# Altium footprint library MEGAphone.PcbLib: 64 footprints (part 3 of 4)
Each footprint in its own frame and in the unit in brackets; x right, y up, seen from the top. Pads: shape width x height; smd on the part's side, far side on the other; paste and mask are expansions set on the pad; w line width, h text height; cw(c..) or ccw(c..) is an arc to the next point about the centre after c.
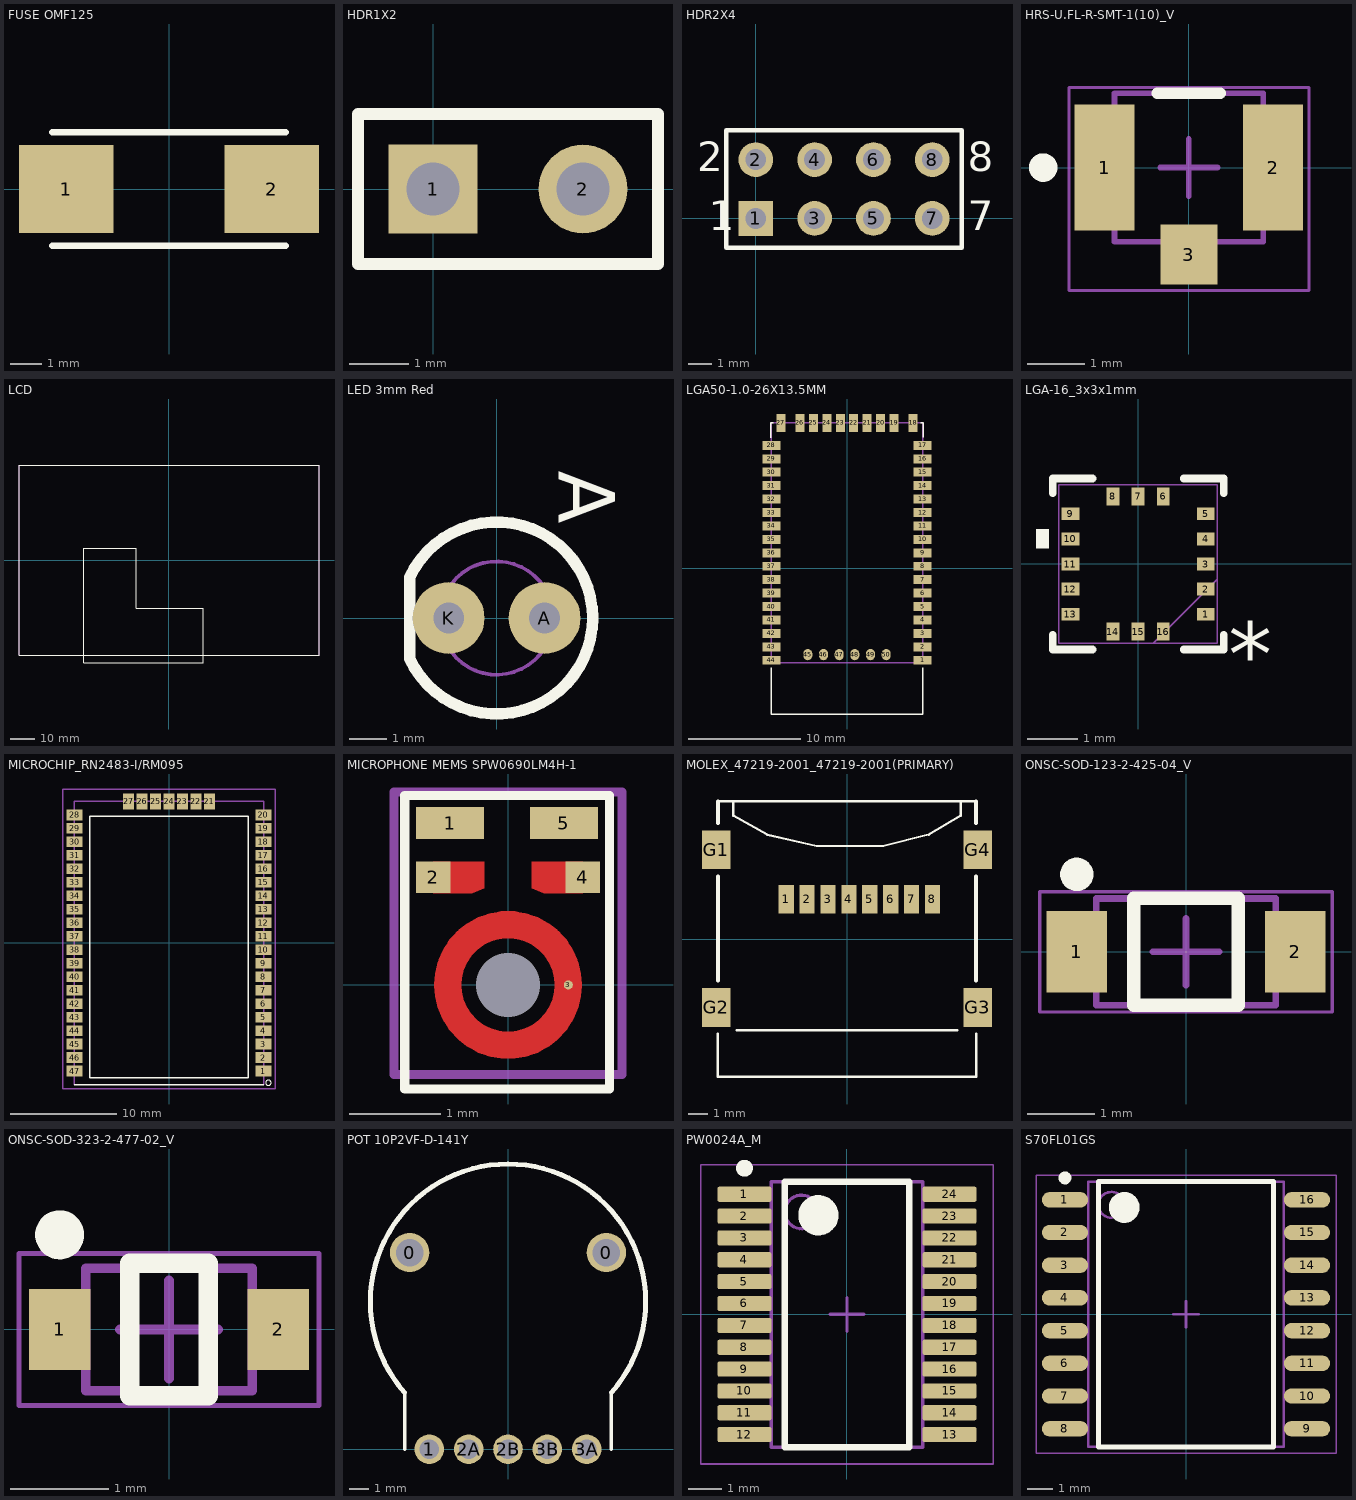
[diagram p2: the footprints below, top view; thin cyan lines are the x and y axes]

## FUSE OMF125 [mm] "SCHURTER OMF125"
height 2.6
pads (2):
  rect 3x2.8 smd: 1(-3.25,0) 2(3.25,0)
Top Overlay:
  lines w0.2: -3.7,-1.8 0,-1.8 3.7,-1.8 ; -3.7,1.8 0,1.8 3.7,1.8
3D body "3404-0010-11.stp": height 2.58, standoff 0.02, extent -3.7,-1.55 3.7,1.55

## HDR1X2 [mm] "Connector; Header; 2 Position"
pads (2):
  rect 1.5x1.5 hole 0.9: 1(0,0)
  round 1.5 hole 0.9: 2(2.54,0)
Top Overlay:
  lines w0.2: -1.27,-1.27 -1.27,1.27 3.81,1.27 3.81,-1.27 -1.27,-1.27

## HDR2X4 [mm] "Connector; Header; 4x2 Position"
pads (8):
  rect 1.5x1.5 hole 0.9: 1(0,0)
  round 1.5 hole 0.9: 2(0,2.54) 3(2.54,0) 4(2.54,2.54) 5(5.08,0) 6(5.08,2.54) 7(7.62,0) 8(7.62,2.54)
Top Overlay:
  lines w0.2: -1.27,-1.27 -1.27,3.81 8.89,3.81 8.89,-1.27 -1.27,-1.27
  text "8" at 9.144,2.032 h1.27
  text "7" at 9.144,-0.508 h1.27
  text "1" at -2.032,-0.508 h1.27
  text "2" at -2.54,2.032 h1.27

## HRS-U.FL-R-SMT-1(10)_V [mm] "SMD, 3-Leads, Body 2.6x2.6mm"
height 1.25
pads (3):
  rect 1.05x2.2 smd: 1(-1.475,0) 2(1.475,0)
  rect 1x1.05 smd: 3(0,-1.525)
Top Overlay:
  circle w0.25: c-2.55,0 r0.125
  lines w0.2: -0.55,1.3 0.55,1.3
Mechanical 13:
  lines w0.1: -1.3,-1.3 -1.3,1.3 1.3,1.3 1.3,-1.3 -1.3,-1.3
Mechanical 15:
  lines w0.05: -2.1,-2.15 -2.1,1.4 2.1,1.4 2.1,-2.15 -2.1,-2.15
  lines w0.1: -0.5,0 0.5,0 ; 0,-0.5 0,0.5
3D body: height 1.25, standoff 0, extent -0.992,-0.998 1,0.998
3D body: height 0.35, standoff 0, extent -1.3,-1.3 1.3,1.3

## LCD [mm]
Top Overlay:
  lines w0.2: -60.25,-38.25 60.25,-38.25 60.25,38.25 -60.25,38.25 -60.25,-38.25 ; -34.25,-41.25 -34.25,-38.25 -34.25,4.75 -13.25,4.75 -13.25,-19.33 13.75,-19.33 13.75,-38.25 13.75,-41.25 -34.25,-41.25
Mechanical 13:
  lines w0.2: -60.25,-38.25 -60.25,38.25 60.25,38.25 60.25,-38.25 -60.25,-38.25
3D body: height 6.5, standoff 3, extent -60.249,-38.249 60.249,38.249

## LED 3mm Red [mm]
height 3.2
pads (2):
  round 1.9 hole 0.813: A(1.27,0) K(-1.27,0)
Top Overlay:
  lines w0.305: -2.302,-1.073 ccw(c0,0) -2.302,1.073 -2.302,-1.073
  text "A" at 1.643,3.899 h1.5
Mechanical 13:
  circle w0.1: c0,0 r1.5
3D body: height 4.7, standoff 1.7, extent -1.488,-1.497 1.496,1.49
3D body: height 3.2, standoff 0.2, extent -1.488,-1.497 1.5,1.497

## LGA50-1.0-26X13.5MM [mm]
pads (50):
  rect 1.6x0.8 smd: 1(6.75,-8.2) 2(6.75,-7) 3(6.75,-5.8) 4(6.75,-4.6) 5(6.75,-3.4) 6(6.75,-2.2) 7(6.75,-1) 8(6.75,0.2) 9(6.75,1.4) 10(6.75,2.6) 11(6.75,3.8) 12(6.75,5) 13(6.75,6.2) 14(6.75,7.4) 15(6.75,8.6) 16(6.75,9.8) 17(6.75,11) 28(-6.75,11) 29(-6.75,9.8) 30(-6.75,8.6) 31(-6.75,7.4) 32(-6.75,6.2) 33(-6.75,5) 34(-6.75,3.8) 35(-6.75,2.6) 36(-6.75,1.4) 37(-6.75,0.2) 38(-6.75,-1) 39(-6.75,-2.2) 40(-6.75,-3.4) 41(-6.75,-4.6) 42(-6.75,-5.8) 43(-6.75,-7) 44(-6.75,-8.2)
  rect 0.8x1.6 smd: 18(5.9,13) 19(4.2,13) 20(3,13) 21(1.8,13) 22(0.6,13) 23(-0.6,13) 24(-1.8,13) 25(-3,13) 26(-4.2,13) 27(-5.9,13)
  oval 0.8x1 smd: 45(-3.5,-7.7) 46(-2.1,-7.7) 47(-0.7,-7.7) 48(0.7,-7.7) 49(2.1,-7.7) 50(3.5,-7.7)
Top Overlay:
  lines w0.127: -6.8,11.684 -6.8,13 -6.604,13 ; -6.75,-8.89 -6.75,-13 6.75,-13 6.75,-8.89 ; 6.604,13 6.8,13 6.8,11.742
Mechanical 13:
  lines w0.127: -6.75,-8.4 -6.75,13 6.75,13 6.75,-8.4 -6.75,-8.4
3D body "User Library-RN52.STEP": height 2.72, standoff -0.01, extent -6.76,-13.01 6.76,13

## LGA-16_3x3x1mm [mil] "Accelerometer"
pads (16):
  rect 14x10 smd paste+0 mask+0: 1(53,-39.37) 2(53,-19.68) 3(53,0) 4(53,19.69) 5(53,39.37) 9(-53,39.37) 10(-53,19.69) 11(-53,0) 12(-53,-19.68) 13(-53,-39.37)
  rect 10x14 smd paste+0 mask+0: 6(19.69,53) 7(0,53) 8(-19.68,53) 14(-19.68,-53) 15(0,-53) 16(19.69,-53)
Top Overlay:
  region: -70,12.19 -80,12.19 -80,27.18 -70,27.18
  lines w6: -67,-55.44 -67,-67 -35.76,-67 ; -67,55.44 -67,67 -35.76,67 ; 35.76,-67 67,-67 67,-55.44 ; 35.76,67 67,67 67,55.44
  text "*" at 105,-25 h50
Mechanical 13:
  lines w1: 12,-62 62,-12 ; -62,-62 62,-62 62,62 -62,62 -62,-62
  text "*" at 58.5,-39.21 h50

## MICROCHIP_RN2483-I/RM095 [mil]
pads (47):
  rect 60x40 smd: 1(350,-475) 2(350,-425) 3(350,-375) 4(350,-325) 5(350,-275) 6(350,-225) 7(350,-175) 8(350,-125) 9(350,-75) 10(350,-25) 11(350,25) 12(350,75) 13(350,125) 14(350,175) 15(350,225) 16(350,275) 17(350,325) 18(350,375) 19(350,425) 20(350,475) 28(-350,475) 29(-350,425) 30(-350,375) 31(-350,325) 32(-350,275) 33(-350,225) 34(-350,175) 35(-350,125) 36(-350,75) 37(-350,25) 38(-350,-25) 39(-350,-75) 40(-350,-125) 41(-350,-175) 42(-350,-225) 43(-350,-275) 44(-350,-325) 45(-350,-375) 46(-350,-425) 47(-350,-475)
  rect 40x60 smd: 21(150,525) 22(100,525) 23(50,525) 24(0,525) 25(-50,525) 26(-100,525) 27(-150,525)
Top Overlay:
  circle w0: c368.5,-518.31 r10
  lines w5: -350.39,-525.59 350.39,-525.59 ; -294.49,-499.61 -294.49,469.69 294.49,469.69 294.49,-499.61 -294.49,-499.61
Mechanical 4:
  lines w5: -393.7,-541.34 -393.7,570.87 393.7,570.87 393.7,-541.34 -393.7,-541.34
Mechanical 13:
  lines w5: -350.39,-525.59 -350.39,525.59 350.39,525.59 350.39,-525.59
3D body "RN2483.STEP": height 131.69, standoff 0, extent -351.38,-526.38 351.38,525

## MICROPHONE MEMS SPW0690LM4H-1 [mm] "MULTIMODE DIGITAL BOTTOM PORT  SISONIC™ MICROPHONE"
height 0.85
pads (6):
  round 0 hole 0.7 unplated: 0(0,0)
  rect 0.748x0.353 smd paste+0 mask+0: 1(-0.635,1.778) 5(0.614,1.778)
  rect 0.374x0.348 smd paste+0 mask+0: 2(-0.821,1.182) 4(0.821,1.182)
  round 0.1 smd paste-10: 3(0.663,0)
Top Layer:
  region: -0.821,1.356 -0.821,1.008 -0.392,1.008 -0.261,1.062 -0.261,1.356
  region: 0.821,1.356 0.821,1.008 0.392,1.008 0.261,1.062 0.261,1.356
  lines w0.3: -0.663,0 cw(c0,0) 0.663,0 cw(c0,0) -0.663,0
Top Overlay:
  lines w0.1: 1.083,2.079 1.113,2.049 ; 1.113,2.079 -1.134,2.079 -1.134,-1.143 1.113,-1.143 1.113,2.08
Top Paste:
  region: 0.821,1.356 0.821,1.008 0.392,1.008 0.261,1.062 0.261,1.356
  region: -0.821,1.356 -0.821,1.008 -0.392,1.008 -0.261,1.062 -0.261,1.356
  lines w0.3: -0.623,-0.227 ccw(c0,0) -0.227,-0.623 ; -0.623,0.227 cw(c0,0) -0.227,0.623 ; 0.227,-0.623 ccw(c0,0) 0.623,-0.227 ; 0.227,0.623 cw(c0,0) 0.623,0.227
Top Solder:
  circle w0.35: c0,0 r0.663
  region: 0.821,1.356 0.821,1.008 0.392,1.008 0.261,1.062 0.261,1.356
  region: -0.821,1.356 -0.821,1.008 -0.392,1.008 -0.261,1.062 -0.261,1.356
Mechanical 13:
  lines w0.1: -1.25,-0.983 0,-0.983 1.25,-0.983 1.25,2.117 -1.25,2.117 -1.25,-0.983
3D body: height 0.85, standoff 0, extent -1.249,-0.982 1.249,2.116

## MOLEX_47219-2001_47219-2001(PRIMARY) [mm]
pads (12):
  rect 0.8x1.5 smd: 1(-3.2,2.1) 2(-2.1,2.1) 3(-1,2.1) 4(0.1,2.1) 5(1.2,2.1) 6(2.3,2.1) 7(3.4,2.1) 8(4.5,2.1)
  rect 1.5x2.05 smd: G1(-6.875,4.7) G2(-6.875,-3.6) G3(6.875,-3.6) G4(6.875,4.7)
Top Overlay:
  lines w0.127: -6.8,-7.25 6.8,-7.25 ; -6.8,-7.2 -6.8,-5 ; -6.8,7.25 6.8,7.25 ; -6,7.2 -6,6.5 -4.2,5.5 -1.6,4.9 1.9,4.9 4.3,5.5 6,6.5 6,7.2 ; -5.8,-4.8 5.8,-4.8 ; 6.8,-7.2 6.8,-5
  lines w0.2: -6.8,-2.2 -6.8,3.3 ; -6.8,6.096 -6.8,7.25 ; 6.8,-2.2 6.8,3.3 ; 6.8,6.096 6.8,7.25
3D body "472192001.stp": height 1.9, standoff 0, extent -7.3,-7.285 7.3,7.215

## ONSC-SOD-123-2-425-04_V [mm] "SOD, 2-Leads, Body 2.69x1.6mm"
height 1.35
pads (2):
  rect 0.91x1.22 smd: 1(-1.635,0) 2(1.635,0)
Top Overlay:
  circle w0.25: c-1.635,1.16 r0.125
  lines w0.2: -0.78,-0.8 0.78,-0.8 0.78,0.8 -0.78,0.8 -0.78,-0.8
Mechanical 13:
  lines w0.1: -1.345,-0.8 1.345,-0.8 1.345,0.8 -1.345,0.8 -1.345,-0.8
Mechanical 15:
  lines w0.05: -2.19,-0.9 2.19,-0.9 2.19,0.9 -2.19,0.9 -2.19,-0.9
  lines w0.1: -0.5,0 0.5,0 ; 0,-0.5 0,0.5
3D body: height 1.35, standoff 0, extent -1.345,-0.8 1.345,0.8

## ONSC-SOD-323-2-477-02_V [mm] "SOD, 2-Leads, Body 1.7x1.25mm"
height 1.062
pads (2):
  rect 0.63x0.83 smd: 1(-1.115,0) 2(1.115,0)
Top Overlay:
  circle w0.25: c-1.115,0.965 r0.125
  lines w0.2: -0.4,-0.675 -0.4,0.675 0.4,0.675 0.4,-0.675 -0.4,-0.675
Mechanical 13:
  lines w0.1: -0.85,-0.625 -0.85,0.625 0.85,0.625 0.85,-0.625 -0.85,-0.625
Mechanical 15:
  lines w0.05: -1.53,-0.775 -1.53,0.775 1.53,0.775 1.53,-0.775 -1.53,-0.775
  lines w0.1: -0.5,0 0.5,0 ; 0,-0.5 0,0.5
3D body: height 1.06, standoff 0, extent -0.85,-0.625 0.85,0.625

## POT 10P2VF-D-141Y [mm] "10MM SIZE THIN MICRO POTENTIOMETER, INSULATED SHAFT SERIES"
height 2.4
pads (7):
  round 2 hole 1.4: 0(-5,10) 0(5,10)
  round 1.5 hole 1: 1(-4,0) 2A(-2,0) 2B(0,0) 3A(4,0) 3B(2,0)
Top Overlay:
  lines w0.2: -5.25,0 -5.25,2.9 ; 5.25,0 5.25,2.9
  lines w0.254: -5.265,2.887 cw(c0,7.5) 0,14.5 cw(c0,7.5) 5.265,2.887

## PW0024A_M [mm] "SOP, 24-Leads, Body 7.9x4.5mm, Pitch 0.65mm, IPC Low Density"
height 1.2
pads (24):
  rrect22% 1.6x0.45 smd: 1(-3.05,3.575) 2(-3.05,2.925) 3(-3.05,2.275) 4(-3.05,1.625) 5(-3.05,0.975) 6(-3.05,0.325) 7(-3.05,-0.325) 8(-3.05,-0.975) 9(-3.05,-1.625) 10(-3.05,-2.275) 11(-3.05,-2.925) 12(-3.05,-3.575) 13(3.05,-3.575) 14(3.05,-2.925) 15(3.05,-2.275) 16(3.05,-1.625) 17(3.05,-0.975) 18(3.05,-0.325) 19(3.05,0.325) 20(3.05,0.975) 21(3.05,1.625) 22(3.05,2.275) 23(3.05,2.925) 24(3.05,3.575)
Top Overlay:
  circle w0.6: c-0.85,2.95 r0.3
  circle w0.25: c-3.05,4.35 r0.125
  lines w0.2: -1.85,-3.95 1.85,-3.95 1.85,3.95 -1.85,3.95 -1.85,-3.95
Mechanical 1:
  text ".Designator" at -1.524,-0.508 h1.02
Mechanical 13:
  circle w0.1: c-1.35,3.05 r0.5
  lines w0.1: -2.25,-3.95 2.25,-3.95 2.25,3.95 -2.25,3.95 -2.25,-3.95
Mechanical 15:
  lines w0.05: -4.35,-4.45 4.35,-4.45 4.35,4.45 -4.35,4.45 -4.35,-4.45
  lines w0.1: -0.5,0 0.5,0 ; 0,-0.5 0,0.5
3D body "PW0024AakaMTC24.stp": height 1, standoff 0, extent -3.21,-3.9 3.21,3.9

## S70FL01GS [mm] "SOP, 16-Leads, Body 10.30x7.50mm, Pitch 1.27mm, IPC Medium Density"
height 2.65
pads (16):
  oval 1.8x0.6 smd: 1(-4.7,4.445) 2(-4.7,3.175) 3(-4.7,1.905) 4(-4.7,0.635) 5(-4.7,-0.635) 6(-4.7,-1.905) 7(-4.7,-3.175) 8(-4.7,-4.445) 9(4.7,-4.445) 10(4.7,-3.175) 11(4.7,-1.905) 12(4.7,-0.635) 13(4.7,0.635) 14(4.7,1.905) 15(4.7,3.175) 16(4.7,4.445)
Top Overlay:
  circle w0.25: c-4.7,5.295 r0.125
  circle w0.6: c-2.4,4.15 r0.3
  lines w0.2: -3.4,-5.15 -3.4,5.15 3.4,5.15 3.4,-5.15 -3.4,-5.15
Mechanical 13:
  circle w0.1: c-2.9,4.25 r0.5
  lines w0.1: -3.8,-5.15 -3.8,5.15 3.8,5.15 3.8,-5.15 -3.8,-5.15
Mechanical 15:
  lines w0.05: -5.825,-5.4 -5.825,5.4 5.825,5.4 5.825,-5.4 -5.825,-5.4
  lines w0.1: -0.5,0 0.5,0 ; 0,-0.5 0,0.5
3D body "S70FL01GS.step": height 2.65, standoff 0, extent -5.15,-5.15 5.15,5.15